# Altium footprint library 元件2.PcbLib: 204 footprints (part 2 of 13)
Each footprint in its own frame and in the unit in brackets; x right, y up, seen from the top. Pads: shape width x height; smd on the part's side, far side on the other; paste and mask are expansions set on the pad; w line width, h text height; cw(c..) or ccw(c..) is an arc to the next point about the centre after c.
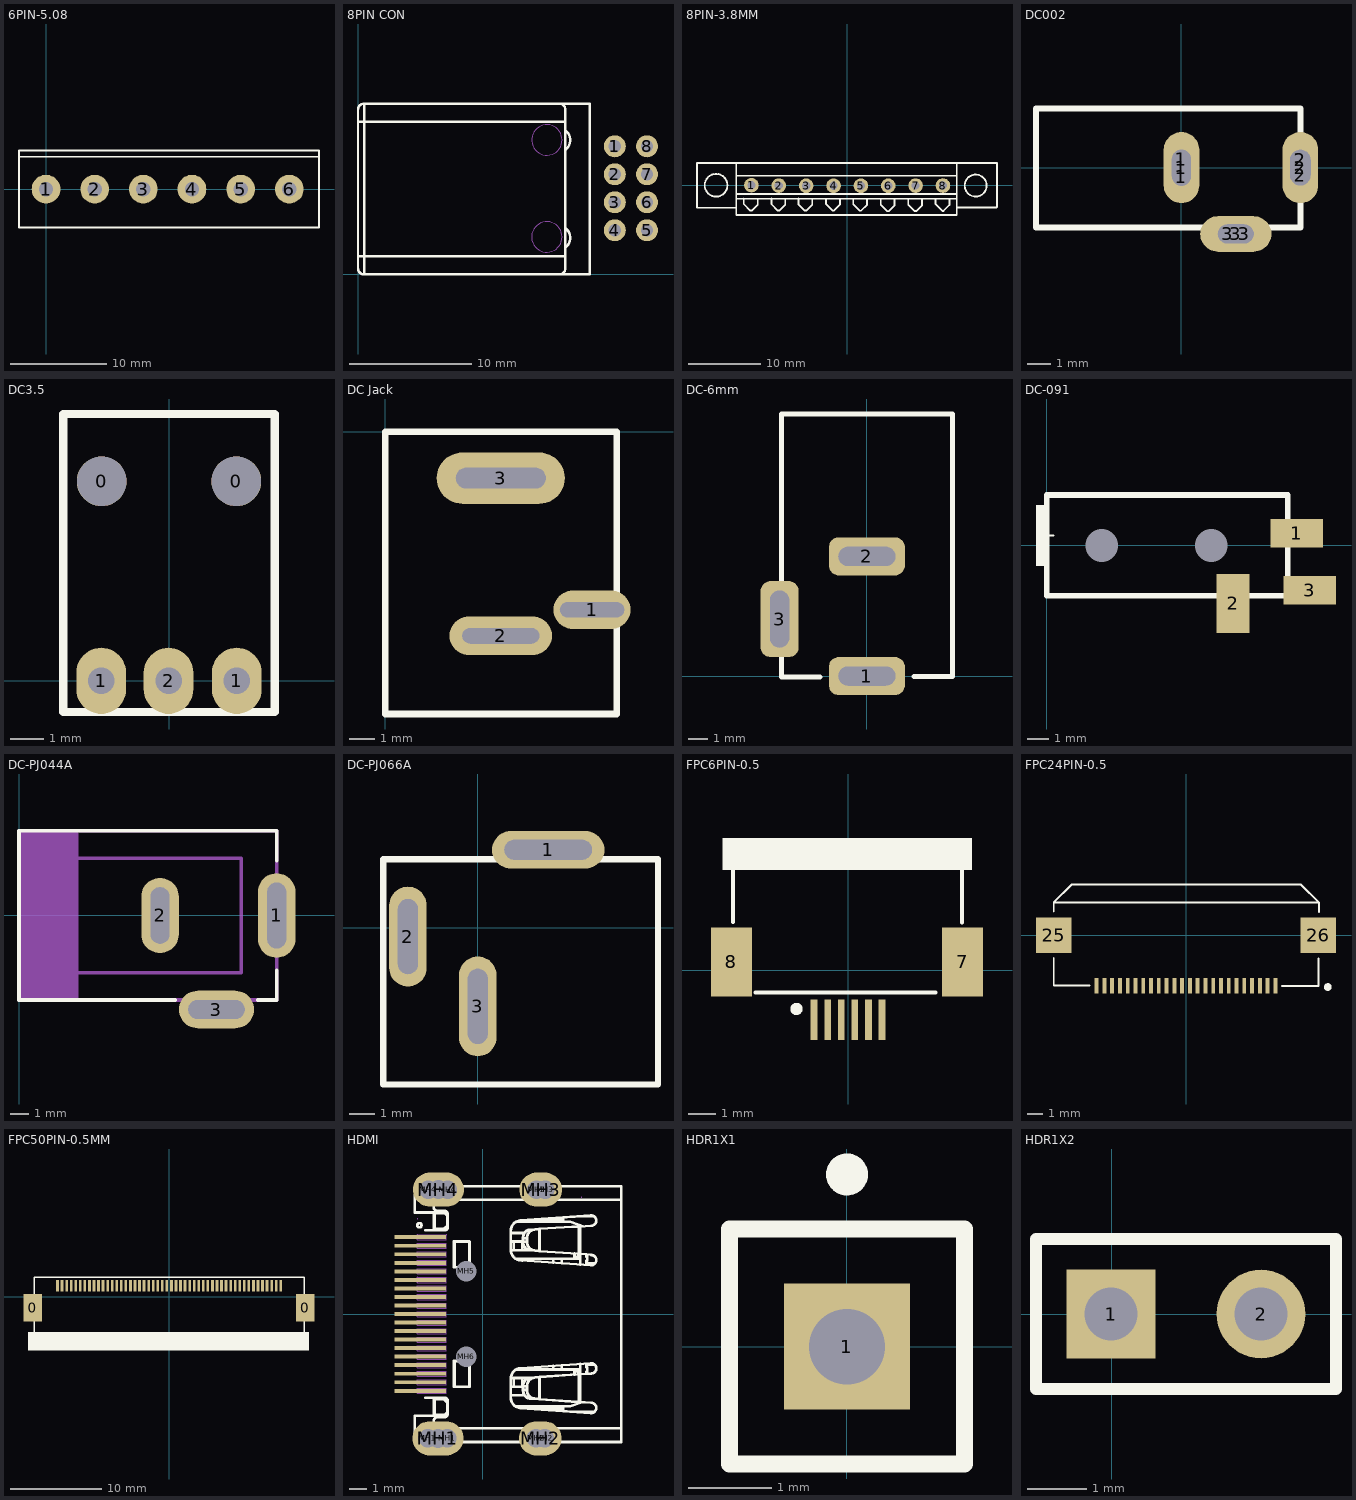
[diagram p1: the footprints below, top view; thin cyan lines are the x and y axes]

## 6PIN-5.08 [mm]
pads (6):
  round 3 hole 1.5: 1(0,0) 2(5.08,0) 3(10.16,0) 4(15.24,0) 5(20.32,0) 6(25.4,0)
Top Overlay:
  lines w0.2: -2.819,3.378 28.473,3.378 ; -2.819,-3.988 -2.819,4.013 28.499,4.013 28.499,-3.988 -2.819,-3.988
3D body "3974.stp": height 14.99, standoff -4.01, extent -1.5,-3.2 26.9,3.15

## 8PIN CON [mm]
pads (8):
  round 1.8 hole 1: 1(21.031,10.49) 2(21.031,8.196) 3(21.031,5.901) 4(21.031,3.607) 5(23.673,3.607) 6(23.673,5.901) 7(23.673,8.196) 8(23.673,10.49)
Top Overlay:
  lines w0.2: -0.019,1.488 16.981,1.488 ; -0.019,12.488 16.981,12.488 ; 16.481,-0.012 ccw(c16.481,0.488) 16.981,0.488 16.981,13.488 ccw(c16.481,13.488) 16.481,13.988 ; 16.981,2.188 ccw(c16.381,2.988) 16.988,3.783 ; 16.981,11.788 cw(c16.381,10.988) 17.006,10.207 ; 18.981,13.97 18.981,-0.012 0.481,-0.012 ; 0.481,-0.012 cw(c0.481,0.488) -0.019,0.488 -0.019,13.488 cw(c0.481,13.488) 0.481,13.988 ; 0.481,-0.012 0.481,13.988 ; 0.481,13.988 18.981,13.988 0.481,13.988
Mechanical 1:
  circle w0.08: c15.466,11.011 r1.25
  circle w0.08: c15.461,3.061 r1.25
3D body "8pchaizuo.stp": height 15.5, standoff -6.43, extent -0.042,0.01 23.958,14.01

## 8PIN-3.8MM [mil]
pads (8):
  round 80 hole 45: 1(-523.5,1.5) 2(-373.93,-0.67) 3(-224.36,-1.5) 4(-74.79,-1.5) 5(74.79,-1.5) 6(224.36,-1.5) 7(373.93,-0.67) 8(523.5,-0.5)
Top Overlay:
  circle w10: c-717,1 r62
  circle w10: c702.17,-0.67 r60
  lines w10: -606.17,-121.5 -821.17,-121.5 -821.17,121.83 818.83,121.83 818.83,-118.17 ; -606.17,120.17 -606.17,-160.67 598.83,-160.67 598.83,116.83 ; -603.67,-73.17 598.83,-73.17 ; -603.67,-47.33 594.67,-47.33 ; -601.17,52.67 597.58,52.67 ; -565.33,-71.5 -565.33,-101.5 -529.5,-137.33 -522.42,-137.33 -489.5,-104.42 -489.5,-76.5 ; 602.17,-120.67 817.58,-120.67 ; -414.5,-101.5 -414.5,-71.5 -414.5,-101.5 ; -414.5,-101.5 -378.67,-137.33 ; -414.5,-101.5 -378.67,-137.33 ; -378.67,-137.33 -371.58,-137.33 -338.67,-104.42 ; -338.67,-104.42 -338.67,-76.5 -338.67,-104.42 ; -267,-101.92 -267,-71.92 -267,-101.92 ; -267,-101.92 -231.17,-137.75 ; -267,-101.92 -231.17,-137.75 ; -231.17,-137.75 -224.08,-137.75 -191.17,-104.83 ; -191.17,-104.83 -191.17,-76.92 -191.17,-104.83 ; -115.75,-102.75 -115.75,-72.75 -115.75,-102.75 ; -115.75,-102.75 -79.92,-138.58 ; -115.75,-102.75 -79.92,-138.58 ; -79.92,-138.58 -72.83,-138.58 -39.92,-105.67 ; -39.92,-105.67 -39.92,-77.75 -39.92,-105.67 ; 32.58,-102.75 32.58,-72.75 32.58,-102.75 ; 32.58,-102.75 68.42,-138.58 ; 32.58,-102.75 68.42,-138.58 ; 68.42,-138.58 75.5,-138.58 108.42,-105.67 ; 108.42,-105.67 108.42,-77.75 108.42,-105.67 ; 183.42,-104.83 183.42,-74.83 183.42,-104.83 ; 183.42,-104.83 219.25,-140.67 ; 183.42,-104.83 219.25,-140.67 ; 219.25,-140.67 226.33,-140.67 259.25,-107.75 ; 259.25,-107.75 259.25,-79.83 259.25,-107.75 ; 333.42,-104.42 333.42,-74.42 333.42,-104.42 ; 333.42,-104.42 369.25,-140.25 ; 333.42,-104.42 369.25,-140.25 ; 369.25,-140.25 376.33,-140.25 409.25,-107.33 ; 409.25,-107.33 409.25,-79.42 409.25,-107.33 ; 483.42,-103.17 483.42,-73.17 483.42,-103.17 ; 483.42,-103.17 519.25,-139 ; 483.42,-103.17 519.25,-139 ; 519.25,-139 526.33,-139 559.25,-106.08 ; 559.25,-106.08 559.25,-78.17 559.25,-106.08
3D body "ECH381V-08P.step": height 362.2, standoff -133.86, extent -617.55,-175 613.55,108.46

## DC002 [mm]
pads (9):
  round 1.5 hole 0.8: 1(0,-0.381) 1(0,0.356) 2(5.004,-0.33) 2(5.004,0.33) 3(1.956,-2.794) 3(2.642,-2.794)
  oval 1.5x3 hole 0.8 slot 1.5 at 90 deg: 1(0,0)
  oval 1.5x3 hole 0.86 slot 1.5 at 90 deg: 2(5.004,0)
  oval 3x1.5 hole 0.8 slot 1.5 at 0 deg: 3(2.286,-2.794)
Top Overlay:
  lines w0.254: -6.121,-2.515 5.004,-2.515 5.004,2.489 -6.121,2.489 -6.121,-2.515
3D body "pj-018.stp": height 7.4, standoff -3.2, extent -6.257,-2.962 5.343,2.438

## DC3.5 [mm] "3.5A"
pads (5):
  round 1.5 hole 1.5: 0(-2.032,6.02) 0(2.032,6.02)
  oval 1.5x2 hole 0.8: 1(-2.045,0) 1(2.045,0) 2(-0.013,0)
Top Overlay:
  lines w0.254: -3.188,-0.94 3.188,-0.94 3.188,8.052 -3.188,8.052 -3.188,-0.94
3D body "pj-036dh.stp": height 5, standoff -3, extent -3,-1.016 3,7.984

## DC Jack [mm]
pads (3):
  oval 3x1.5 hole 0.6 slot 2.5 at 0 deg: 1(8.052,-6.934)
  oval 4x1.5 hole 0.6 slot 3 at 0 deg: 2(4.496,-7.95)
  oval 5x2 hole 0.8 slot 3.5 at 0 deg: 3(4.496,-1.803)
Top Overlay:
  lines w0.254: 0,-10.998 0,0 9.017,0 9.017,-10.998 0,-10.998
3D body "pj-044a.stp": height 14, standoff -3.2, extent 0.021,-10.949 9.021,0.051

## DC-6mm [mm]
pads (3):
  rrect50% 4x2 hole 1 slot 3 at 0 deg: 1(0,0) 2(0,6.3)
  rrect50% 2x4 hole 1 slot 3 at 90 deg: 3(-4.6,3)
Top Overlay:
  lines w0.254: -4.5,1 -4.5,-0.043 -2.457,-0.043 ; -4.5,5 -4.5,13.8 4.5,13.8 4.5,-0.018 2.482,-0.018
3D body "User Library-dc range - dc connector[4840_2201].STEP": height 11.02, standoff -3.48, extent -5.003,-0.043 4.503,13.783

## DC-091 [mm]
pads (5):
  round 0 hole 1.5 mask+0: 0(2.5,0) 0(7.5,0)
  rect 2.4x1.3 smd: 1(11.4,0.55) 3(12,-2.05)
  rect 1.5x2.7 smd: 2(8.5,-2.65)
Top Overlay:
  rectangle: -0.5,-0.95 0.1,1.85
  lines w0.1: -0.2,0.45 0.3,0.45
  lines w0.254: 0,-2.3 11,-2.3 11,2.3 0,2.3 0,-2.3
3D body "DC.STEP": height 4.4, standoff -0.8, extent 0.025,-3.875 12.625,2.425

## DC-PJ044A [mm]
pads (3):
  oval 2x4.5 hole 1 slot 3.5 at 90 deg: 1(13.7,0)
  oval 2x4 hole 1 slot 3 at 90 deg: 2(7.5,0)
  oval 4x2 hole 1 slot 3 at 0 deg: 3(10.5,-5)
Top Overlay:
  lines w0.2: 8.3,-4.5 0,-4.5 0,4.5 13.7,4.5 13.7,2.917 ; 12.7,-4.5 13.7,-4.5 13.7,-2.917
Mechanical 7:
  rectangle: 0,-4.5 3.175,4.5
  lines w0.2: 0,-3.048 11.811,-3.048 11.811,3.048 0,3.048 ; 0,-4.5 12.7,-4.5 13.7,-4.5 13.7,4.5 0,4.5 0,-4.5
  lines w1: 7.5,-1 7.5,1 ; 9.5,-5 11.5,-5 ; 13.7,-1.2 13.7,1.2
3D body "Power Jack - TSH-3655-PBT-T.stp": height 11, standoff -3.5, extent -0.149,-5.004 14.351,4.496

## DC-PJ066A [mm]
pads (3):
  oval 4.5x1.5 hole 0.8 slot 3.5 at 0 deg: 1(2.819,3.124)
  oval 1.5x4 hole 0.8 slot 3 at 90 deg: 2(-2.794,-0.349) 3(0,-3.143)
Top Overlay:
  lines w0.254: -3.785,-6.267 -3.785,2.75 7.214,2.75 7.214,-6.267 -3.785,-6.267
3D body "DC_KLDVX-0202-A_rA6.STEP": height 13.5, standoff -4.3, extent -3.607,-6.222 7.393,3.378

## FPC6PIN-0.5 [mm]
pads (8):
  rect 0.25x1.5 smd: 1(-1.25,-1.825) 2(-0.75,-1.825) 3(-0.25,-1.825) 4(0.25,-1.825) 5(0.75,-1.825) 6(1.25,-1.825)
  rect 1.524x2.54 smd: 7(4.216,0.305) 8(-4.293,0.305)
Top Overlay:
  circle w0.254: c-1.9,-1.425 r0.1
  region: 3,4.775 3,4.775 3,4.425 3,4.425
  region: 4.572,4.877 -4.623,4.877 -4.623,3.683 4.572,3.683
  lines w0.15: -4.242,1.778 -4.242,4.775 3.835,4.775 ; -3.404,-0.825 3,-0.825 ; 2.6,-0.825 3.226,-0.825 ; 4.191,1.753 4.191,4.724
3D body "FFC6PIN卧": height 2.12, standoff -0.19, extent -4.603,-1.973 4.552,4.674

## FPC24PIN-0.5 [mm] "CAMERA ROTARY FPC 24 WAY 0.5 PITCH"
pads (26):
  rect 0.25x1 smd: 1(5.75,-3.25) 2(5.25,-3.25) 3(4.75,-3.25) 4(4.25,-3.25) 5(3.75,-3.25) 6(3.25,-3.25) 7(2.75,-3.25) 8(2.25,-3.25) 9(1.75,-3.25) 10(1.25,-3.25) 11(0.75,-3.25) 12(0.25,-3.25) 13(-0.25,-3.25) 14(-0.75,-3.25) 15(-1.25,-3.25) 16(-1.75,-3.25) 17(-2.25,-3.25) 18(-2.75,-3.25) 19(-3.25,-3.25) 20(-3.75,-3.25) 21(-4.25,-3.25) 22(-4.75,-3.25) 23(-5.25,-3.25) 24(-5.75,-3.25)
  rect 2.286x2.286 smd: 25(-8.509,0) 26(8.509,0)
Top Overlay:
  circle w0.254: c9.123,-3.34 r0.117
  lines w0.127: -8.51,-3.251 -8.51,-1.48 ; -8.51,1.51 -8.51,2.11 ; 8.53,-3.251 8.53,-1.5 ; 8.54,2.11 -8.51,2.11 ; 8.56,1.49 8.56,2.09 7.399,3.251 -7.369,3.251 -8.51,2.11
  lines w0.128: -8.5,-3.24 -6.22,-3.24 ; 6.18,-3.26 8.53,-3.26
3D body "User Library-ov9655.STEP": height 5.85, standoff -0.18, extent -6.17,-0.55 6.33,20.95
3D body "33944.STEP": height 2, standoff 0, extent -8.04,-4.56 8.06,1.34

## FPC50PIN-0.5MM [mm]
pads (52):
  rect 2x3 smd: 0(-14.986,-1.219) 0(14.935,-1.219)
  rect 0.3x1.25 smd: 1(12.24,1.181) 2(11.74,1.181) 3(11.24,1.181) 4(10.74,1.181) 5(10.24,1.181) 6(9.74,1.181) 7(9.24,1.181) 8(8.74,1.181) 9(8.24,1.181) 10(7.74,1.181) 11(7.24,1.181) 12(6.74,1.181) 13(6.24,1.181) 14(5.74,1.181) 15(5.24,1.181) 16(4.74,1.181) 17(4.24,1.181) 18(3.74,1.181) 19(3.24,1.181) 20(2.74,1.181) 21(2.24,1.181) 22(1.74,1.181) 23(1.24,1.181) 24(0.74,1.181) 25(0.24,1.181) 26(-0.26,1.181) 27(-0.76,1.181) 28(-1.26,1.181) 29(-1.76,1.181) 30(-2.26,1.181) 31(-2.76,1.181) 32(-3.26,1.181) 33(-3.76,1.181) 34(-4.26,1.181) 35(-4.76,1.181) 36(-5.26,1.181) 37(-5.76,1.181) 38(-6.26,1.181) 39(-6.76,1.181) 40(-7.26,1.181) 41(-7.76,1.181) 42(-8.26,1.181) 43(-8.76,1.181) 44(-9.26,1.181) 45(-9.76,1.181) 46(-10.26,1.181) 47(-10.76,1.181) 48(-11.26,1.181) 49(-11.76,1.181) 50(-12.26,1.181)
Top Overlay:
  rectangle: -15.494,-5.944 15.342,-3.886
  lines w0.2: -14.808,-4.928 14.808,-4.928 14.808,2.108 -14.808,2.108 -14.808,-4.928
3D body "FFC50IPIN卧": height 2.1, standoff 0.05, extent -15.26,-5.759 15.24,1.391

## HDMI [mm]
pads (33):
  rect 3x0.23 smd: 1(-3.664,4.5) 2(-3.664,4) 3(-3.664,3.5) 4(-3.664,3) 5(-3.664,2.5) 6(-3.664,2) 7(-3.664,1.5) 8(-3.664,1) 9(-3.664,0.5) 10(-3.664,0) 11(-3.664,-0.5) 12(-3.664,-1) 13(-3.664,-1.5) 14(-3.664,-2) 15(-3.664,-2.5) 16(-3.664,-3) 17(-3.664,-3.5) 18(-3.664,-4) 19(-3.664,-4.5)
  round 1.1 hole 1.1: MH1(-3.22,-7.283) MH1(-2.077,-7.283) MH2(3.13,-7.283) MH2(3.638,-7.283) MH3(3.156,7.283) MH3(3.664,7.283) MH4(-3.194,7.283) MH4(-2.051,7.283)
  oval 3x2 hole 1.1: MH1(-2.624,-7.29) MH4(-2.598,7.29)
  oval 2.5x2 hole 1: MH2(3.376,-7.29) MH3(3.402,7.29)
  round 1.1 hole 1.2: MH5(-0.964,2.5) MH6(-0.964,-2.5)
Top Overlay:
  drawing of 560 lines, arcs and shapes, not listed
Mechanical 1:
  drawing of 1444 lines, arcs and shapes, not listed
Mechanical 2:
  circle w0.006: c3.724,-7.255 r0.003
  circle w0.006: c3.724,7.245 r0.003
  circle w0.006: c5.787,6.845 r0.003
  circle w0.006: c3.724,6.845 r0.003
  circle w0.006: c3.724,7.645 r0.003
  circle w0.006: c-2.576,-7.655 r0.003
  circle w0.006: c3.424,-7.655 r0.003
  circle w0.006: c-3.821,3.995 r0.003
  circle w0.006: c-3.821,4.495 r0.003
  circle w0.006: c-3.821,-4.505 r0.003
  circle w0.006: c-3.821,4.495 r0.003
  circle w0.006: c-3.821,5.58 r0.003
  circle w0.006: c-3.821,4.635 r0.003
  circle w0.006: c-2.125,4.635 r0.003
  circle w0.006: c-3.821,1.845 r0.003
  circle w0.006: c-3.821,2.145 r0.003
Mechanical 3:
  text "19" at -1.85,-4.263 h0.25
  text "18" at -1.85,-3.761 h0.25
  text "2" at -1.85,4.102 h0.25
  text "1" at -1.85,4.573 h0.25
3D body "User Library-10029449-001LF.STEP": height 5.98, standoff -2.02, extent -3.513,-8.354 6.387,7.846

## HDR1X1 [mm] "Generic Antenna; 1 Lead"
pads (1):
  rect 1.5x1.5 hole 0.9: 1(0,0)
Top Overlay:
  circle w0.25: c0,2.05 r0.125
  lines w0.2: -1.4,-1.4 1.4,-1.4 1.4,1.4 -1.4,1.4 -1.4,-1.4
3D body "1001-1.STEP": height 8.54, standoff -3, extent -1.27,-1.27 1.27,1.27

## HDR1X2 [mm]
height 1.1
pads (2):
  rect 1.5x1.5 hole 0.9: 1(-0.01,0.007)
  round 1.5 hole 0.9: 2(2.53,0.007)
Top Overlay:
  lines w0.2: -1.28,-1.263 3.8,-1.263 3.8,1.277 -1.28,1.277 -1.28,-1.263
3D body "1x2HDR.stp": height 8.41, standoff -2.52, extent -1.279,-1.261 3.801,1.279